# Altium footprint library 集大电协1.5.PcbLib: 227 footprints (part 3 of 18)
Each footprint in its own frame and in the unit in brackets; x right, y up, seen from the top. Pads: shape width x height; smd on the part's side, far side on the other; paste and mask are expansions set on the pad; w line width, h text height; cw(c..) or ccw(c..) is an arc to the next point about the centre after c.
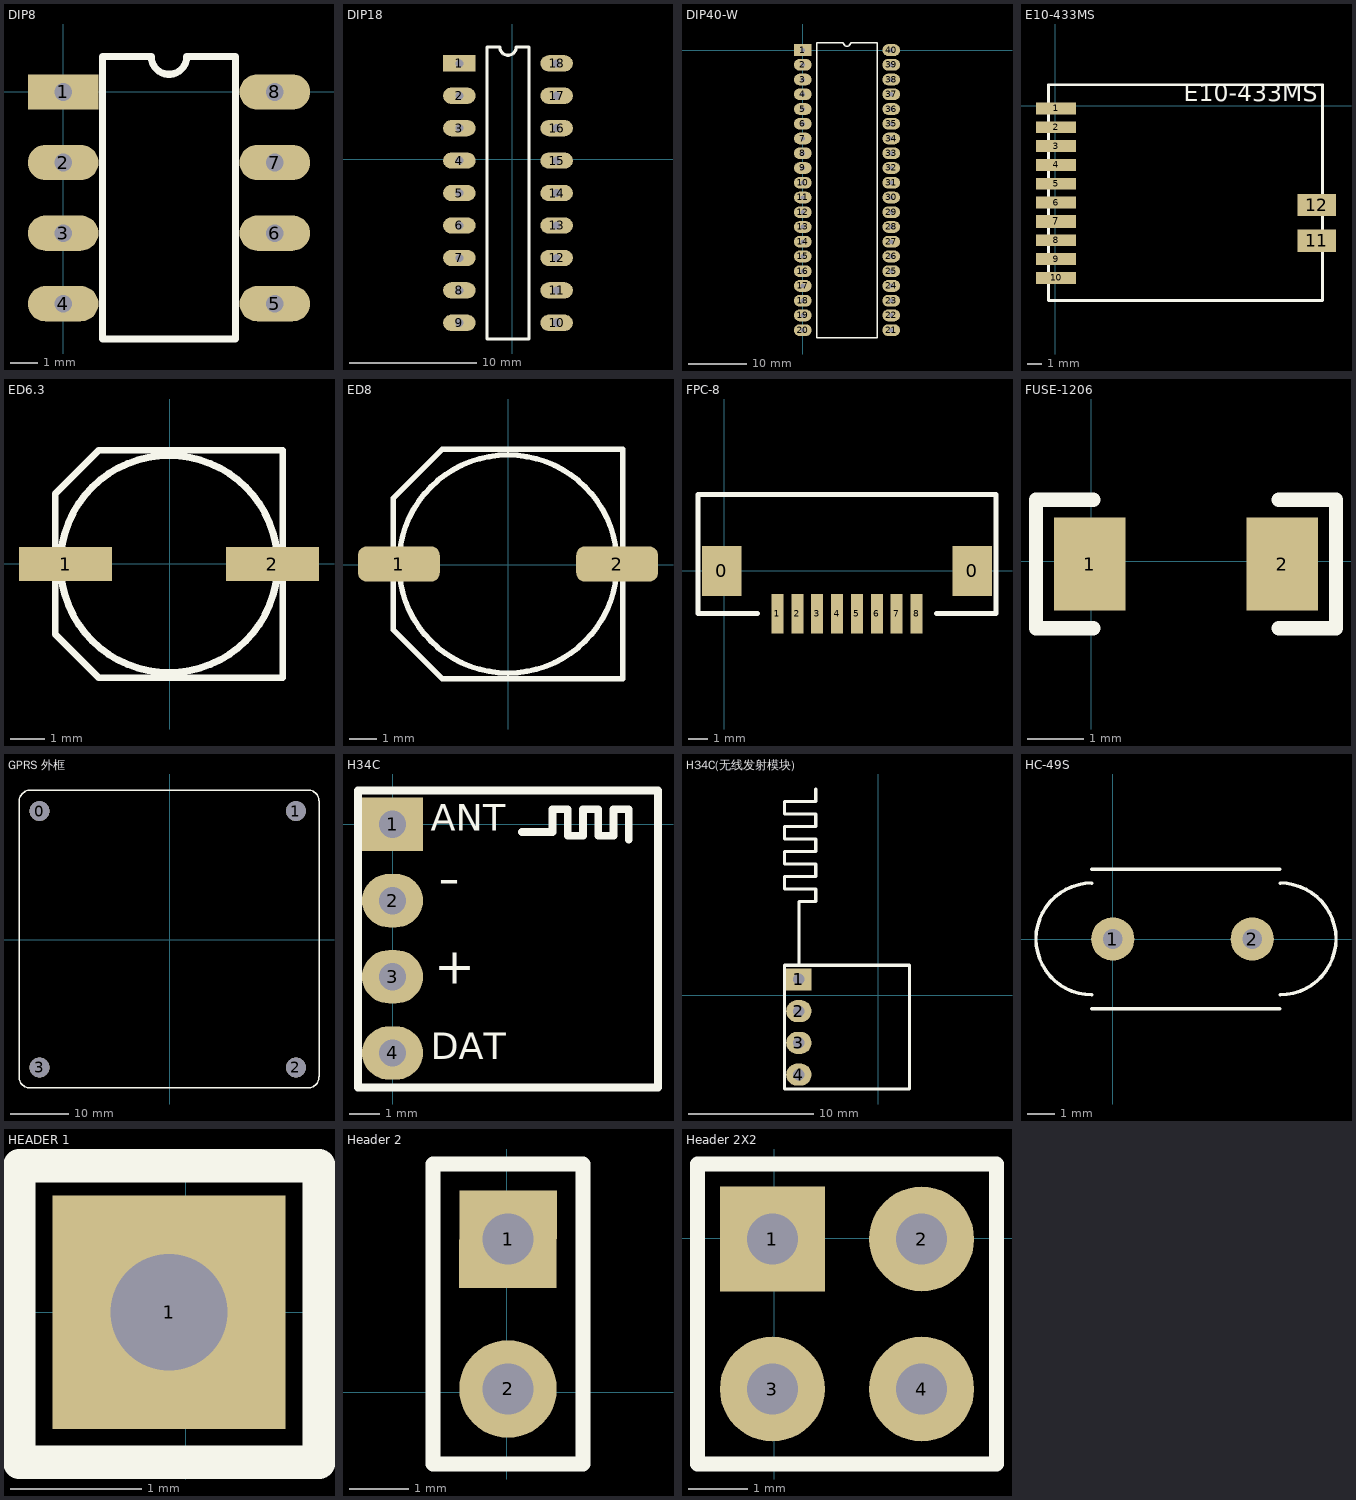
[diagram p2: the footprints below, top view; thin cyan lines are the x and y axes]

## DIP8 [mm]
pads (8):
  rect 2.54x1.27 hole 0.635: 1(0,0)
  oval 2.54x1.27 hole 0.635: 2(0,-2.54) 3(0,-5.08) 4(0,-7.62) 5(7.62,-7.62) 6(7.62,-5.08) 7(7.62,-2.54) 8(7.62,0)
Top Overlay:
  lines w0.254: 1.422,-8.89 1.422,1.27 3.175,1.27 ccw(c3.81,1.27) 4.445,1.27 6.198,1.27 6.198,-8.89 1.422,-8.89
3D body "DIP-8.STEP": height 4.56, standoff -3.82, extent 0.003,-8.765 7.823,1.145

## DIP10 [mm]

## DIP18 [mil]
pads (18):
  rect 100x50 hole 25: 1(-163,295)
  oval 100x50 hole 25: 2(-163,195) 3(-163,95) 4(-163,-5) 5(-163,-105) 6(-163,-205) 7(-163,-305) 8(-163,-405) 9(-163,-505) 10(137,-505) 11(137,-405) 12(137,-305) 13(137,-205) 14(137,-105) 15(137,-5) 16(137,95) 17(137,195) 18(137,295)
Top Overlay:
  lines w10: -78,-555 -78,345 -38,345 ccw(c-13,345) 12,345 52,345 52,-555 -78,-555
3D body "User Library-DIP18-1.STEP": height 179.92, standoff -150, extent -163.93,-565.48 143.94,349.49

## DIP40-W [mil]
pads (40):
  rect 120x80 hole 30: 1(0,0)
  oval 120x80 hole 30: 2(0,-100) 3(0,-200) 4(0,-300) 5(0,-400) 6(0,-500) 7(0,-600) 8(0,-700) 9(0,-800) 10(0,-900) 11(0,-1000) 12(0,-1100) 13(0,-1200) 14(0,-1300) 15(0,-1400) 16(0,-1500) 17(0,-1600) 18(0,-1700) 19(0,-1800) 20(0,-1900) 21(600,-1900) 22(600,-1800) 23(600,-1700) 24(600,-1600) 25(600,-1500) 26(600,-1400) 27(600,-1300) 28(600,-1200) 29(600,-1100) 30(600,-1000) 31(600,-900) 32(600,-800) 33(600,-700) 34(600,-600) 35(600,-500) 36(600,-400) 37(600,-300) 38(600,-200) 39(600,-100) 40(600,0)
Top Overlay:
  lines w10: 95,-1950 505,-1950 505,50 325,50 cw(c300,50) 275,50 95,50 95,-1950
3D body "User Library-DIP-40.STEP": height 195.08, standoff -94.49, extent -6.7,-1968.74 604.72,88.74

## E10-433MS [mm]
pads (12):
  rect 2.7x0.8 smd: 1(0.068,-0.188) 2(0.068,-1.458) 3(0.068,-2.728) 4(0.068,-3.998) 5(0.068,-5.268) 6(0.068,-6.538) 8(0.068,-9.078) 9(0.068,-10.348) 10(0.068,-11.618)
  rect 2.7x0.9 smd: 7(0.068,-7.808)
  rect 2.6x1.5 smd: 11(17.64,-9.113) 12(17.64,-6.703)
Top Overlay:
  lines w0.2: -0.452,1.367 -0.452,-13.143 18.018,-13.143 18.018,1.407 -0.452,1.407
  text "E10-433MS" at 8.675,-0.1 h2
3D body: height 0.76, standoff 0, extent -0.45,-13.15 17.975,1.425
3D body: height 1.27, standoff 0, extent 3.05,-6.1 6.65,-2.65

## ED6.3 [mm]
pads (2):
  rect 2.7x1 smd: 1(-3.015,-0.003) 2(2.985,-0.003)
Top Overlay:
  circle w0.2: c-0.015,-0.003 r3.15
  lines w0.2: -3.315,2.029 -3.315,-2.035 -2.047,-3.303 3.285,-3.303 3.285,3.297 -2.047,3.297 -3.303,2.042
3D body "SL-E.step": height 5.2, standoff 0, extent -3.515,-3.305 3.485,3.295

## ED8 [mm]
pads (2):
  rrect50% 3x1.3 smd: 1(-4.005,0.028) 2(3.995,0.028)
Top Overlay:
  circle w0.2: c-0.005,0.028 r4
  lines w0.2: -4.205,-2.385 -4.205,2.441 -2.418,4.228 4.195,4.228 4.195,-4.172 -2.418,-4.172 -4.205,-2.385
3D body "SL-H.step": height 10.5, standoff 0, extent -4.526,-4.188 4.474,4.112

## FPC-8 [mm]
pads (10):
  rect 2x2.5 smd: 0(-0.133,-0.009) 0(12.467,-0.009)
  rect 0.6x2 smd: 1(2.667,-2.159) 2(3.667,-2.159) 3(4.667,-2.159) 4(5.667,-2.159) 5(6.667,-2.159) 6(7.667,-2.159) 7(8.667,-2.159) 8(9.667,-2.159)
Top Overlay:
  lines w0.254: 1.667,-2.159 -1.333,-2.159 -1.333,3.841 13.667,3.841 13.667,-2.159 10.667,-2.159

## FUSE-1206 [mil]
pads (2):
  rect 50x65 smd: 1(-1,-2) 2(134,-2)
Top Overlay:
  lines w10: 1.5,-47 -38.5,-47 -38.5,43 1.5,43 ; 131.5,-47 171.5,-47 171.5,43 131.5,43
3D body "9.STEP": height 34.25, standoff 0, extent 1.01,-35.78 126.99,28

## GPRS 外框 [mm]
pads (4):
  round 3.45 hole 3.42: 0(-22.466,22.203) 1(21.73,22.203) 2(21.73,-21.993) 3(-22.466,-21.993)
Top Overlay:
  lines w0.254: -26,-23.6 ccw(c-24.1,-23.6) -24.1,-25.5 23.8,-25.5 ccw(c23.8,-23.6) 25.7,-23.6 25.7,23.952 ccw(c23.852,23.952) 23.852,25.8 -24,25.8 ccw(c-24,23.8) -26,23.8 -26,-23.6
3D body: height 10, standoff 8, extent -25.857,-25.629 25.806,25.781
3D body: height 8, standoff 0, extent -24.111,-23.717 -20.715,-20.319
3D body: height 8, standoff 0, extent 20.085,-23.717 23.481,-20.319
3D body: height 8, standoff 0, extent 19.984,20.505 23.379,23.902
3D body: height 8, standoff 0, extent -24.162,20.505 -20.766,23.902

## H34C [mil]
pads (4):
  rect 80x70 hole 36: 1(0,0)
  oval 80x70 hole 36: 2(0,-100) 3(0,-200) 4(0,-300)
Top Overlay:
  lines w10: 170,-10 210,-10 210,20 230,20 230,-15 250,-15 250,20 270,20 270,-15 290,-15 290,20 310,20 310,-10 310,-20 ; -45.28,-345.28 348.43,-345.28 348.43,44.49 84.65,44.49 -45.28,44.49 -45.28,-345.28
  text "ANT" at 50,-20 h60
  text "-" at 60,-115 h100
  text "+" at 55,-225 h80
  text "DAT" at 50,-320 h60
3D body "HDR1X4_2.54mm.STEP": height 336.22, standoff -118.11, extent -50,-350 50,50
3D body: height 40, standoff 30, extent 175,-300 275,0
3D body: height 30, standoff 0, extent -40,-340 345,40

## H34C(无线发射模块) [mil]
pads (4):
  rect 80x70 hole 36: 1(-250,50)
  oval 80x70 hole 36: 2(-250,-50) 3(-250,-150) 4(-250,-250)
Top Overlay:
  lines w10: -250,94.49 -250,295.28 -196.85,295.28 -196.85,334.65 -295.28,334.65 -295.28,374.02 -196.85,374.02 -196.85,413.39 -295.28,413.39 -295.28,452.76 -196.85,452.76 -196.85,492.13 -295.28,492.13 -295.28,531.5 -196.85,531.5 -196.85,570.87 -295.28,570.87 -295.28,610.24 -196.85,610.24 -196.85,649.61 ; -295.28,-295.28 -295.28,94.49 -165.35,94.49 98.43,94.49 98.43,-295.28 -295.28,-295.28

## HC-49S [mil]
pads (2):
  round 62 hole 28: 1(0,0) 2(200,0)
Top Overlay:
  lines w5: -30,-100.31 239.69,-100.31 ; -30,-80 cw(c-30,0.16) -30,80.31 ; -30,100.31 239.69,100.31 ; 240,-80 ccw(c240,0.16) 240,80.31
3D body "XTAL.STEP": height 142.73, standoff -77.74, extent -113.55,-101.53 326.32,82.43

## HEADER 1 [mil]
pads (1):
  rect 70x70 hole 35: 1(-5,0)
Top Overlay:
  lines w10: -50,-45 40,-45 40,44 12,44 -22,44 -50,44 -50,-45

## Header 2 [mil]
pads (2):
  rect 65x65 hole 34: 1(0.81,102.01)
  round 65 hole 34: 2(0.81,2.01)
Top Overlay:
  lines w10: -49.19,-47.99 50.81,-47.99 50.81,152.01 -49.19,152.01 -49.19,-47.99
3D body "User Library-CONMHS2A-2mm54.STEP": height 314.96, standoff -118.11, extent -46,-49.99 54,150.01

## Header 2X2 [mil]
pads (4):
  rect 70x70 hole 34: 1(-1.16,-0.35)
  round 70 hole 34: 2(98.25,-0.35) 3(-1.16,-100.35) 4(98.25,-100.35)
Top Overlay:
  lines w10: 48.25,-150.35 148.25,-150.35 148.25,49.65 48.25,49.65 ; 48.84,-150.35 -51.16,-150.35 -51.16,49.65 48.84,49.65
3D body "User Library-CONMHS2A-2mm54.STEP": height 314.96, standoff -118.11, extent -47.97,-152.35 52.03,47.65
3D body "User Library-CONMHS2A-2mm54.STEP": height 314.96, standoff -118.11, extent 51.44,-152.35 151.44,47.65